# Altium footprint library RODION.PcbLib: 131 footprints (part 3 of 9)
Each footprint in its own frame and in the unit in brackets; x right, y up, seen from the top. Pads: shape width x height; smd on the part's side, far side on the other; paste and mask are expansions set on the pad; w line width, h text height; cw(c..) or ccw(c..) is an arc to the next point about the centre after c.
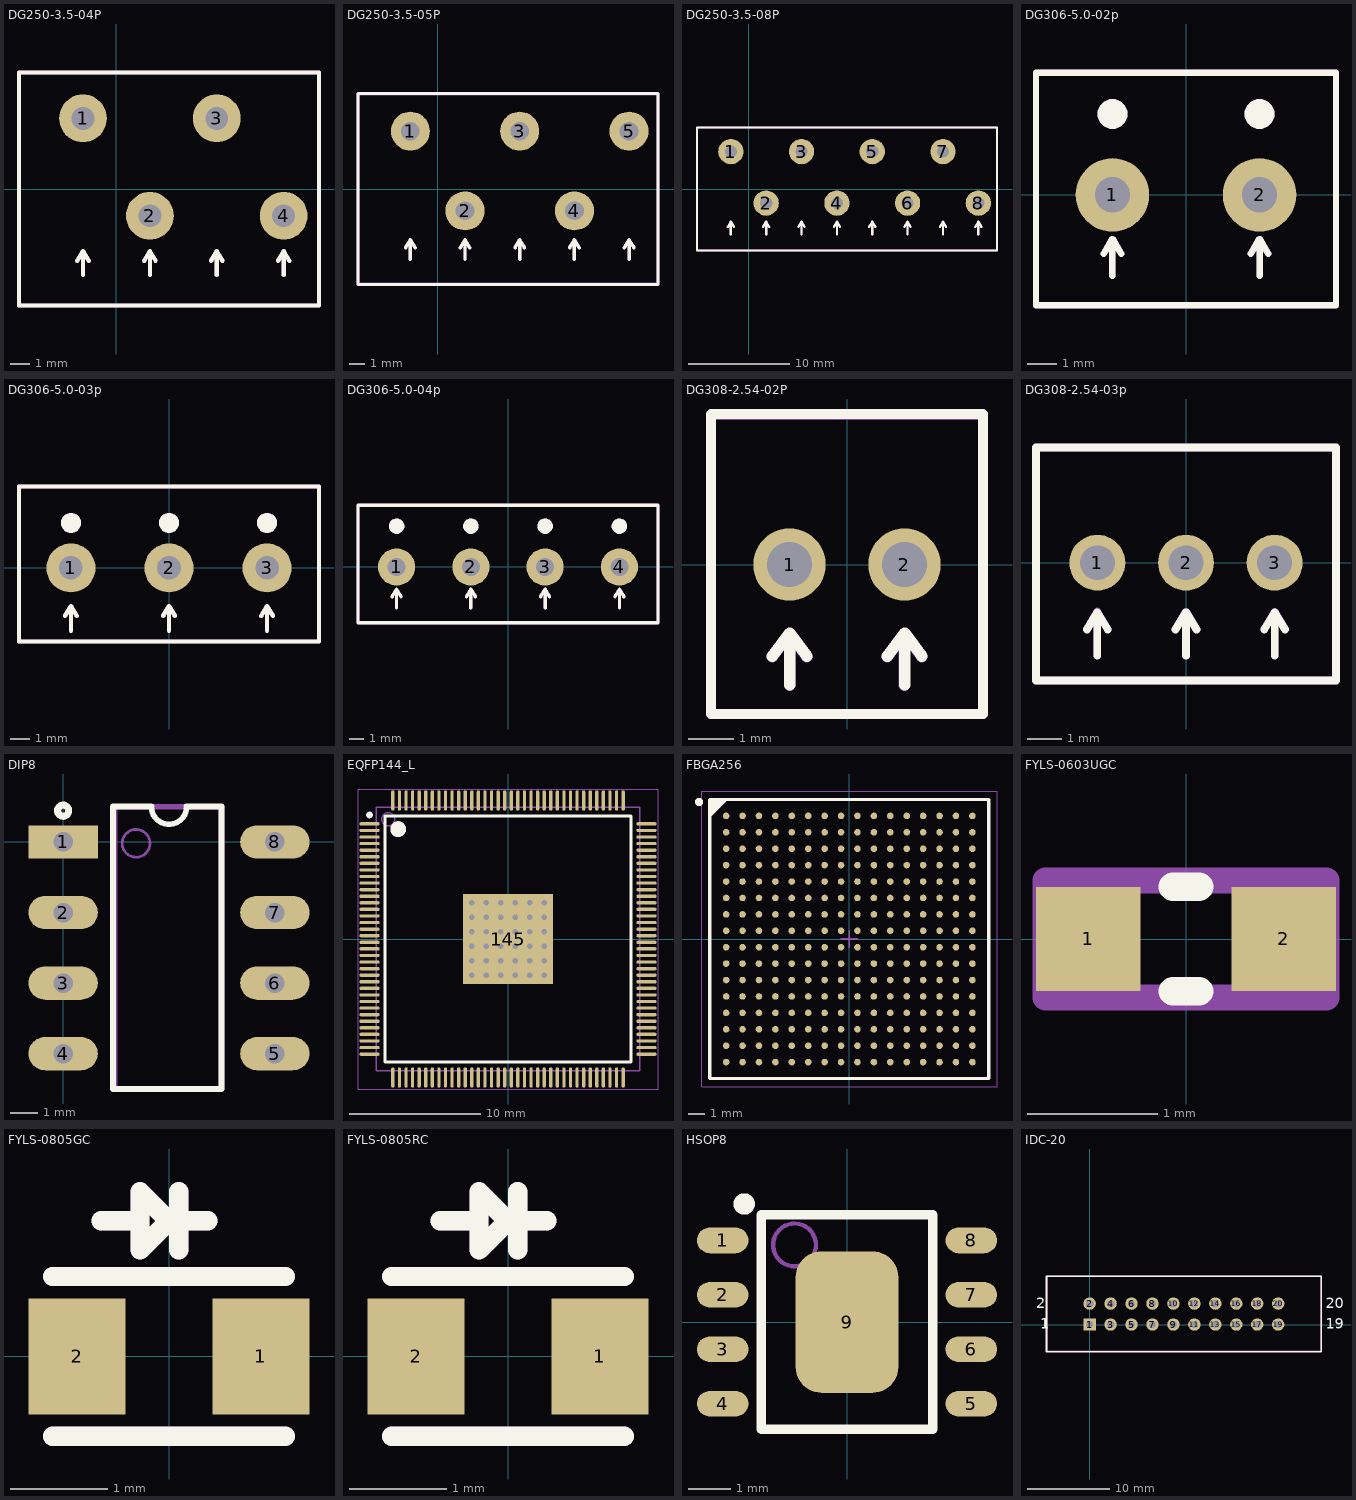
[diagram p2: the footprints below, top view; thin cyan lines are the x and y axes]

## DG250-3.5-04P [mm] "DG250-5.0-4p Connector"
height 12
pads (4):
  round 2.5 hole 1.2: 1(-1.75,3.7) 2(1.75,-1.4) 3(5.25,3.7) 4(8.75,-1.4)
Top Overlay:
  lines w0.2: -5.1,-6.1 -5.1,6.1 10.6,6.1 10.6,-6.1 -5.1,-6.1
  lines w0.22: -2.05,-3.75 -1.75,-3.25 ; -1.75,-4.5 -1.75,-3.25 ; -1.45,-3.75 -1.75,-3.25 ; 1.45,-3.75 1.75,-3.25 ; 1.75,-4.5 1.75,-3.25 ; 2.05,-3.75 1.75,-3.25 ; 4.95,-3.75 5.25,-3.25 ; 5.25,-4.5 5.25,-3.25 ; 5.55,-3.75 5.25,-3.25 ; 8.45,-3.75 8.75,-3.25 ; 8.75,-4.5 8.75,-3.25 ; 9.05,-3.75 8.75,-3.25
Top_Assy:
  lines w0.22: -2.05,-3.75 -1.75,-3.25 ; -1.75,-4.5 -1.75,-3.25 ; -1.45,-3.75 -1.75,-3.25 ; 1.45,-3.75 1.75,-3.25 ; 1.75,-4.5 1.75,-3.25 ; 2.05,-3.75 1.75,-3.25 ; 4.95,-3.75 5.25,-3.25 ; 5.25,-4.5 5.25,-3.25 ; 5.55,-3.75 5.25,-3.25 ; 8.45,-3.75 8.75,-3.25 ; 8.75,-4.5 8.75,-3.25 ; 9.05,-3.75 8.75,-3.25 ; -5.1,-6.1 -5.1,6.1 10.6,6.1 10.6,-6.1 -5.1,-6.1
  text ".Designator" at -2.425,0.45 h1
3D body "DG250-3.5-4.stp": height 13.05, standoff -3.25, extent -5,-6 10.5,6

## DG250-3.5-05P [mm] "DG250-5.0-4p Connector"
height 12
pads (5):
  round 2.5 hole 1.2: 1(-1.75,3.7) 2(1.75,-1.4) 3(5.25,3.7) 4(8.75,-1.4) 5(12.25,3.7)
Top Overlay:
  lines w0.2: -5.1,-6.1 14.1,-6.1 14.1,6.1 -5.1,6.1 -5.1,-6.1
  lines w0.22: -2.05,-3.75 -1.75,-3.25 ; -1.75,-4.5 -1.75,-3.25 ; -1.45,-3.75 -1.75,-3.25 ; 1.45,-3.75 1.75,-3.25 ; 1.75,-4.5 1.75,-3.25 ; 2.05,-3.75 1.75,-3.25 ; 4.95,-3.75 5.25,-3.25 ; 5.25,-4.5 5.25,-3.25 ; 5.55,-3.75 5.25,-3.25 ; 8.45,-3.75 8.75,-3.25 ; 8.75,-4.5 8.75,-3.25 ; 9.05,-3.75 8.75,-3.25 ; 11.95,-3.75 12.25,-3.25 ; 12.25,-4.5 12.25,-3.25 ; 12.55,-3.75 12.25,-3.25
Top_Assy:
  lines w0.22: -2.05,-3.75 -1.75,-3.25 ; -1.75,-4.5 -1.75,-3.25 ; -1.45,-3.75 -1.75,-3.25 ; 1.45,-3.75 1.75,-3.25 ; 1.75,-4.5 1.75,-3.25 ; 2.05,-3.75 1.75,-3.25 ; 4.95,-3.75 5.25,-3.25 ; 5.25,-4.5 5.25,-3.25 ; 5.55,-3.75 5.25,-3.25 ; 8.45,-3.75 8.75,-3.25 ; 8.75,-4.5 8.75,-3.25 ; 9.05,-3.75 8.75,-3.25 ; 11.95,-3.75 12.25,-3.25 ; 12.25,-4.5 12.25,-3.25 ; 12.55,-3.75 12.25,-3.25 ; -5.1,-6.1 14.1,-6.1 14.1,6.1 -5.1,6.1 -5.1,-6.1
  text ".Designator" at 0.375,1.05 h1
3D body "DG250-3.5-5.stp": height 13.05, standoff -3.25, extent -5,-6 14,6

## DG250-3.5-08P [mm] "DG250-5.0-8p Connector"
height 12
pads (8):
  round 2.5 hole 1.2: 1(-1.75,3.7) 2(1.75,-1.4) 3(5.25,3.7) 4(8.75,-1.4) 5(12.25,3.7) 6(15.75,-1.4) 7(19.25,3.7) 8(22.75,-1.4)
Top Overlay:
  lines w0.2: -5.1,-6.1 -5.1,6.1 24.6,6.1 24.6,-6.1 -5.1,-6.1
  lines w0.22: -2.05,-3.75 -1.75,-3.25 ; -1.75,-4.5 -1.75,-3.25 ; -1.45,-3.75 -1.75,-3.25 ; 1.45,-3.75 1.75,-3.25 ; 1.75,-4.5 1.75,-3.25 ; 2.05,-3.75 1.75,-3.25 ; 4.95,-3.75 5.25,-3.25 ; 5.25,-4.5 5.25,-3.25 ; 5.55,-3.75 5.25,-3.25 ; 8.45,-3.75 8.75,-3.25 ; 8.75,-4.5 8.75,-3.25 ; 9.05,-3.75 8.75,-3.25 ; 11.95,-3.75 12.25,-3.25 ; 12.25,-4.5 12.25,-3.25 ; 12.55,-3.75 12.25,-3.25 ; 15.45,-3.75 15.75,-3.25 ; 15.75,-4.5 15.75,-3.25 ; 16.05,-3.75 15.75,-3.25 ; 18.95,-3.75 19.25,-3.25 ; 19.25,-4.5 19.25,-3.25 ; 19.55,-3.75 19.25,-3.25 ; 22.45,-3.75 22.75,-3.25 ; 22.75,-4.5 22.75,-3.25 ; 23.05,-3.75 22.75,-3.25
Top_Assy:
  lines w0.22: -2.05,-3.75 -1.75,-3.25 ; -1.75,-4.5 -1.75,-3.25 ; -1.45,-3.75 -1.75,-3.25 ; 1.45,-3.75 1.75,-3.25 ; 1.75,-4.5 1.75,-3.25 ; 2.05,-3.75 1.75,-3.25 ; 4.95,-3.75 5.25,-3.25 ; 5.25,-4.5 5.25,-3.25 ; 5.55,-3.75 5.25,-3.25 ; 8.45,-3.75 8.75,-3.25 ; 8.75,-4.5 8.75,-3.25 ; 9.05,-3.75 8.75,-3.25 ; 11.95,-3.75 12.25,-3.25 ; 12.25,-4.5 12.25,-3.25 ; 12.55,-3.75 12.25,-3.25 ; 15.45,-3.75 15.75,-3.25 ; 15.75,-4.5 15.75,-3.25 ; 16.05,-3.75 15.75,-3.25 ; 18.95,-3.75 19.25,-3.25 ; 19.25,-4.5 19.25,-3.25 ; 19.55,-3.75 19.25,-3.25 ; 22.45,-3.75 22.75,-3.25 ; 22.75,-4.5 22.75,-3.25 ; 23.05,-3.75 22.75,-3.25 ; -5.1,-6.1 -5.1,6.1 24.6,6.1 24.6,-6.1 -5.1,-6.1
  text ".Designator" at 3.7,1.4 h1
3D body "DG250-3.5-8.stp": height 13.05, standoff -3.25, extent -5,-6 24.5,6

## DG306-5.0-02p [mm] "DG306-5.0-2p Connector"
height 10
pads (2):
  round 2.5 hole 1.2: 1(-2.5,0) 2(2.5,0)
Top Overlay:
  region: -2.5,2.25 -2.599,2.25 -2.783,2.326 -2.924,2.467 -3,2.651 -3,2.75 -3,2.849 -2.924,3.033 -2.783,3.174 -2.599,3.25 -2.5,3.25 -2.401,3.25 -2.217,3.174 -2.076,3.033 -2,2.849 -2,2.75 -2,2.651 -2.076,2.467 -2.217,2.326 -2.401,2.25
  region: 2.5,2.25 2.401,2.25 2.217,2.326 2.076,2.467 2,2.651 2,2.75 2,2.849 2.076,3.033 2.217,3.174 2.401,3.25 2.5,3.25 2.599,3.25 2.783,3.174 2.924,3.033 3,2.849 3,2.75 3,2.651 2.924,2.467 2.783,2.326 2.599,2.25
  lines w0.22: -2.8,-2 -2.5,-1.5 ; -2.5,-2.75 -2.5,-1.5 ; -2.2,-2 -2.5,-1.5 ; 2.2,-2 2.5,-1.5 ; 2.5,-2.75 2.5,-1.5 ; 2.8,-2 2.5,-1.5 ; -5.1,-3.75 -5.1,4.15 5.1,4.15 5.1,-3.75 -5.1,-3.75
Top_Assy:
  region: -2.5,2.25 -2.599,2.25 -2.783,2.326 -2.924,2.467 -3,2.651 -3,2.75 -3,2.849 -2.924,3.033 -2.783,3.174 -2.599,3.25 -2.5,3.25 -2.401,3.25 -2.217,3.174 -2.076,3.033 -2,2.849 -2,2.75 -2,2.651 -2.076,2.467 -2.217,2.326 -2.401,2.25
  region: 2.5,2.25 2.401,2.25 2.217,2.326 2.076,2.467 2,2.651 2,2.75 2,2.849 2.076,3.033 2.217,3.174 2.401,3.25 2.5,3.25 2.599,3.25 2.783,3.174 2.924,3.033 3,2.849 3,2.75 3,2.651 2.924,2.467 2.783,2.326 2.599,2.25
  lines w0.22: -2.8,-2 -2.5,-1.5 ; -2.5,-2.75 -2.5,-1.5 ; -2.2,-2 -2.5,-1.5 ; 2.2,-2 2.5,-1.5 ; 2.5,-2.75 2.5,-1.5 ; 2.8,-2 2.5,-1.5 ; -5.1,-3.75 -5.1,4.15 5.1,4.15 5.1,-3.75 -5.1,-3.75
  text ".Designator" at -1.525,0.65 h1
3D body "KRM2.STEP": height 10, standoff -4, extent -5,-3.5 5,4

## DG306-5.0-03p [mm] "DG306-5.0-3p Connector"
height 10
pads (3):
  round 2.5 hole 1.2: 1(-5,0) 2(0,0) 3(5,0)
Top Overlay:
  region: -5,1.8 -5.099,1.8 -5.283,1.876 -5.424,2.017 -5.5,2.201 -5.5,2.3 -5.5,2.399 -5.424,2.583 -5.283,2.724 -5.099,2.8 -5,2.8 -4.901,2.8 -4.717,2.724 -4.576,2.583 -4.5,2.399 -4.5,2.3 -4.5,2.201 -4.576,2.017 -4.717,1.876 -4.901,1.8
  region: 0,1.8 -0.099,1.8 -0.283,1.876 -0.424,2.017 -0.5,2.201 -0.5,2.3 -0.5,2.399 -0.424,2.583 -0.283,2.724 -0.099,2.8 0,2.8 0.099,2.8 0.283,2.724 0.424,2.583 0.5,2.399 0.5,2.3 0.5,2.201 0.424,2.017 0.283,1.876 0.099,1.8
  region: 4.5,2.3 4.5,2.201 4.576,2.017 4.717,1.876 4.901,1.8 5,1.8 5.099,1.8 5.283,1.876 5.424,2.017 5.5,2.201 5.5,2.3 5.5,2.399 5.424,2.583 5.283,2.724 5.099,2.8 5,2.8 4.901,2.8 4.717,2.724 4.576,2.583 4.5,2.399
  lines w0.22: -5.3,-2.45 -5,-1.95 ; -5,-3.2 -5,-1.95 ; -4.7,-2.45 -5,-1.95 ; -0.3,-2.45 0,-1.95 ; 0,-3.2 0,-1.95 ; 0.3,-2.45 0,-1.95 ; 4.7,-2.45 5,-1.95 ; 5,-3.2 5,-1.95 ; 5.3,-2.45 5,-1.95 ; -7.65,-3.75 7.65,-3.75 7.65,4.15 -7.65,4.15 -7.65,-3.75
Top_Assy:
  region: -5,1.8 -5.099,1.8 -5.283,1.876 -5.424,2.017 -5.5,2.201 -5.5,2.3 -5.5,2.399 -5.424,2.583 -5.283,2.724 -5.099,2.8 -5,2.8 -4.901,2.8 -4.717,2.724 -4.576,2.583 -4.5,2.399 -4.5,2.3 -4.5,2.201 -4.576,2.017 -4.717,1.876 -4.901,1.8
  region: 0,1.8 -0.099,1.8 -0.283,1.876 -0.424,2.017 -0.5,2.201 -0.5,2.3 -0.5,2.399 -0.424,2.583 -0.283,2.724 -0.099,2.8 0,2.8 0.099,2.8 0.283,2.724 0.424,2.583 0.5,2.399 0.5,2.3 0.5,2.201 0.424,2.017 0.283,1.876 0.099,1.8
  region: 4.5,2.3 4.5,2.201 4.576,2.017 4.717,1.876 4.901,1.8 5,1.8 5.099,1.8 5.283,1.876 5.424,2.017 5.5,2.201 5.5,2.3 5.5,2.399 5.424,2.583 5.283,2.724 5.099,2.8 5,2.8 4.901,2.8 4.717,2.724 4.576,2.583 4.5,2.399
  lines w0.22: -5.3,-2.45 -5,-1.95 ; -5,-3.2 -5,-1.95 ; -4.7,-2.45 -5,-1.95 ; -0.3,-2.45 0,-1.95 ; 0,-3.2 0,-1.95 ; 0.3,-2.45 0,-1.95 ; 4.7,-2.45 5,-1.95 ; 5,-3.2 5,-1.95 ; 5.3,-2.45 5,-1.95 ; -7.65,-3.75 7.65,-3.75 7.65,4.15 -7.65,4.15 -7.65,-3.75
  text ".Designator" at -2.75,0.825 h1
3D body "KRM3.STEP": height 10, standoff -4, extent -7.5,-3.5 7.5,4

## DG306-5.0-04p [mm] "DG306-5.0-4p Connector"
height 10
pads (4):
  round 2.5 hole 1.2: 1(-7.5,0) 2(-2.5,0) 3(2.5,0) 4(7.5,0)
Top Overlay:
  region: 7,2.75 7,2.651 7.076,2.467 7.217,2.326 7.401,2.25 7.5,2.25 7.599,2.25 7.783,2.326 7.924,2.467 8,2.651 8,2.75 8,2.849 7.924,3.033 7.783,3.174 7.599,3.25 7.5,3.25 7.401,3.25 7.217,3.174 7.076,3.033 7,2.849
  region: -7.5,2.25 -7.599,2.25 -7.783,2.326 -7.924,2.467 -8,2.651 -8,2.75 -8,2.849 -7.924,3.033 -7.783,3.174 -7.599,3.25 -7.5,3.25 -7.401,3.25 -7.217,3.174 -7.076,3.033 -7,2.849 -7,2.75 -7,2.651 -7.076,2.467 -7.217,2.326 -7.401,2.25
  region: 2.5,2.25 2.401,2.25 2.217,2.326 2.076,2.467 2,2.651 2,2.75 2,2.849 2.076,3.033 2.217,3.174 2.401,3.25 2.5,3.25 2.599,3.25 2.783,3.174 2.924,3.033 3,2.849 3,2.75 3,2.651 2.924,2.467 2.783,2.326 2.599,2.25
  region: -2.5,2.25 -2.599,2.25 -2.783,2.326 -2.924,2.467 -3,2.651 -3,2.75 -3,2.849 -2.924,3.033 -2.783,3.174 -2.599,3.25 -2.5,3.25 -2.401,3.25 -2.217,3.174 -2.076,3.033 -2,2.849 -2,2.75 -2,2.651 -2.076,2.467 -2.217,2.326 -2.401,2.25
  lines w0.22: -7.8,-2 -7.5,-1.5 ; -7.5,-2.75 -7.5,-1.5 ; -7.2,-2 -7.5,-1.5 ; -2.8,-2 -2.5,-1.5 ; -2.5,-2.75 -2.5,-1.5 ; -2.2,-2 -2.5,-1.5 ; 2.2,-2 2.5,-1.5 ; 2.5,-2.75 2.5,-1.5 ; 2.8,-2 2.5,-1.5 ; 7.2,-2 7.5,-1.5 ; 7.5,-2.75 7.5,-1.5 ; 7.8,-2 7.5,-1.5 ; -10.1,-3.75 10.1,-3.75 10.1,4.15 -10.1,4.15 -10.1,-3.75
Top_Assy:
  region: 7,2.75 7,2.651 7.076,2.467 7.217,2.326 7.401,2.25 7.5,2.25 7.599,2.25 7.783,2.326 7.924,2.467 8,2.651 8,2.75 8,2.849 7.924,3.033 7.783,3.174 7.599,3.25 7.5,3.25 7.401,3.25 7.217,3.174 7.076,3.033 7,2.849
  region: -7.5,2.25 -7.599,2.25 -7.783,2.326 -7.924,2.467 -8,2.651 -8,2.75 -8,2.849 -7.924,3.033 -7.783,3.174 -7.599,3.25 -7.5,3.25 -7.401,3.25 -7.217,3.174 -7.076,3.033 -7,2.849 -7,2.75 -7,2.651 -7.076,2.467 -7.217,2.326 -7.401,2.25
  region: 2.5,2.25 2.401,2.25 2.217,2.326 2.076,2.467 2,2.651 2,2.75 2,2.849 2.076,3.033 2.217,3.174 2.401,3.25 2.5,3.25 2.599,3.25 2.783,3.174 2.924,3.033 3,2.849 3,2.75 3,2.651 2.924,2.467 2.783,2.326 2.599,2.25
  region: -2.5,2.25 -2.599,2.25 -2.783,2.326 -2.924,2.467 -3,2.651 -3,2.75 -3,2.849 -2.924,3.033 -2.783,3.174 -2.599,3.25 -2.5,3.25 -2.401,3.25 -2.217,3.174 -2.076,3.033 -2,2.849 -2,2.75 -2,2.651 -2.076,2.467 -2.217,2.326 -2.401,2.25
  lines w0.22: -7.8,-2 -7.5,-1.5 ; -7.5,-2.75 -7.5,-1.5 ; -7.2,-2 -7.5,-1.5 ; -2.8,-2 -2.5,-1.5 ; -2.5,-2.75 -2.5,-1.5 ; -2.2,-2 -2.5,-1.5 ; 2.2,-2 2.5,-1.5 ; 2.5,-2.75 2.5,-1.5 ; 2.8,-2 2.5,-1.5 ; 7.2,-2 7.5,-1.5 ; 7.5,-2.75 7.5,-1.5 ; 7.8,-2 7.5,-1.5 ; -10.1,-3.75 10.1,-3.75 10.1,4.15 -10.1,4.15 -10.1,-3.75
  text ".Designator" at -4.6,0.95 h1
3D body "KRM4.STEP": height 10, standoff -4, extent -10,-3.5 10,4

## DG308-2.54-02P [mm] "DG308-2.54-02P Connector"
height 8.5
pads (2):
  round 1.6 hole 1: 1(-1.27,0) 2(1.27,0)
Top Overlay:
  lines w0.22: -3,-3.3 3,-3.3 3,3.325 -3,3.325 -3,-3.3
  lines w0.254: -1.646,-2.025 -1.265,-1.517 ; -1.265,-2.66 -1.265,-1.517 ; -0.884,-2.025 -1.265,-1.517 ; 0.894,-2.025 1.275,-1.517 ; 1.275,-2.66 1.275,-1.517 ; 1.656,-2.025 1.275,-1.517
Top_Assy:
  lines w0.22: -3,-3.302 3,-3.302 3,3.302 -3,3.302 -3,-3.302
  lines w0.254: -1.651,-2.032 -1.27,-1.524 ; -1.27,-2.667 -1.27,-1.524 ; -0.889,-2.032 -1.27,-1.524 ; 0.889,-2.032 1.27,-1.524 ; 1.27,-2.667 1.27,-1.524 ; 1.651,-2.032 1.27,-1.524
  text ".Designator" at -1.525,0.375 h1
3D body "DG308-2.54-2P.stp": height 8.5, standoff -3.5, extent -2.77,-3.125 2.77,3.075

## DG308-2.54-03p [mm] "DG308-2.54-3p Connector"
height 8.5
pads (3):
  round 1.6 hole 1: 1(-2.54,0) 2(0,0) 3(2.54,0)
Top Overlay:
  lines w0.22: -2.84,-1.917 -2.54,-1.417 ; -2.54,-2.667 -2.54,-1.417 ; -2.24,-1.917 -2.54,-1.417 ; -0.3,-1.917 0,-1.417 ; 0,-2.667 0,-1.417 ; 0.3,-1.917 0,-1.417 ; 2.24,-1.917 2.54,-1.417 ; 2.54,-2.667 2.54,-1.417 ; 2.84,-1.917 2.54,-1.417 ; -4.3,-3.375 4.3,-3.375 4.3,3.3 -4.3,3.3 -4.3,-3.375
Top_Assy:
  lines w0.22: -2.84,-1.9 -2.54,-1.4 ; -2.54,-2.65 -2.54,-1.4 ; -2.24,-1.9 -2.54,-1.4 ; -0.3,-1.904 0,-1.404 ; 0,-2.654 0,-1.404 ; 0.3,-1.904 0,-1.404 ; 2.24,-1.902 2.54,-1.402 ; 2.54,-2.652 2.54,-1.402 ; 2.84,-1.902 2.54,-1.402 ; -4.3,-3.375 4.3,-3.375 4.3,3.3 -4.3,3.3 -4.3,-3.375
  text ".Designator" at -0.7,0.4 h1
3D body "DG308-2.54-3P.stp": height 8.5, standoff -3.5, extent -4.04,-3.125 4.04,3.075

## DIP8 [mm]
pads (8):
  rect 2.5x1.2 hole 0.7: 1(0,0)
  oval 2.5x1.2 hole 0.7: 2(0,-2.54) 3(0,-5.08) 4(0,-7.62) 5(7.62,-7.62) 6(7.62,-5.08) 7(7.62,-2.54) 8(7.62,0)
Top Overlay:
  circle w0.254: c0,1.125 r0.2
  lines w0.2: 3.175,1.27 ccw(c3.81,1.27) 4.445,1.27
  lines w0.22: 3.175,1.27 1.8,1.27 1.8,-8.89 5.7,-8.89 5.7,1.27 4.445,1.27
Top_Assy:
  circle w0.1: c2.625,-0.05 r0.5
  lines w0.2: 1.85,-8.875 1.85,1.27 5.7,1.27 5.7,-8.875 1.85,-8.875
  text ".Designator" at 2.625,-3.325 h1

## EQFP144_L [mm] "Shrink QFP, 144-Leads, Body 20x20mm, Pitch 0.5mm, Thermal Pad 6.85x6.85mm, IPC High Density"
height 1.65
pads (145):
  oval 1.55x0.25 smd: 1(-10.525,8.75) 2(-10.525,8.25) 3(-10.525,7.75) 4(-10.525,7.25) 5(-10.525,6.75) 6(-10.525,6.25) 7(-10.525,5.75) 8(-10.525,5.25) 9(-10.525,4.75) 10(-10.525,4.25) 11(-10.525,3.75) 12(-10.525,3.25) 13(-10.525,2.75) 14(-10.525,2.25) 15(-10.525,1.75) 16(-10.525,1.25) 17(-10.525,0.75) 18(-10.525,0.25) 19(-10.525,-0.25) 20(-10.525,-0.75) 21(-10.525,-1.25) 22(-10.525,-1.75) 23(-10.525,-2.25) 24(-10.525,-2.75) 25(-10.525,-3.25) 26(-10.525,-3.75) 27(-10.525,-4.25) 28(-10.525,-4.75) 29(-10.525,-5.25) 30(-10.525,-5.75) 31(-10.525,-6.25) 32(-10.525,-6.75) 33(-10.525,-7.25) 34(-10.525,-7.75) 35(-10.525,-8.25) 36(-10.525,-8.75) 73(10.525,-8.75) 74(10.525,-8.25) 75(10.525,-7.75) 76(10.525,-7.25) 77(10.525,-6.75) 78(10.525,-6.25) 79(10.525,-5.75) 80(10.525,-5.25) 81(10.525,-4.75) 82(10.525,-4.25) 83(10.525,-3.75) 84(10.525,-3.25) 85(10.525,-2.75) 86(10.525,-2.25) 87(10.525,-1.75) 88(10.525,-1.25) 89(10.525,-0.75) 90(10.525,-0.25) 91(10.525,0.25) 92(10.525,0.75) 93(10.525,1.25) 94(10.525,1.75) 95(10.525,2.25) 96(10.525,2.75) 97(10.525,3.25) 98(10.525,3.75) 99(10.525,4.25) 100(10.525,4.75) 101(10.525,5.25) 102(10.525,5.75) 103(10.525,6.25) 104(10.525,6.75) 105(10.525,7.25) 106(10.525,7.75) 107(10.525,8.25) 108(10.525,8.75)
  oval 0.25x1.55 smd: 37(-8.75,-10.525) 38(-8.25,-10.525) 39(-7.75,-10.525) 40(-7.25,-10.525) 41(-6.75,-10.525) 42(-6.25,-10.525) 43(-5.75,-10.525) 44(-5.25,-10.525) 45(-4.75,-10.525) 46(-4.25,-10.525) 47(-3.75,-10.525) 48(-3.25,-10.525) 49(-2.75,-10.525) 50(-2.25,-10.525) 51(-1.75,-10.525) 52(-1.25,-10.525) 53(-0.75,-10.525) 54(-0.25,-10.525) 55(0.25,-10.525) 56(0.75,-10.525) 57(1.25,-10.525) 58(1.75,-10.525) 59(2.25,-10.525) 60(2.75,-10.525) 61(3.25,-10.525) 62(3.75,-10.525) 63(4.25,-10.525) 64(4.75,-10.525) 65(5.25,-10.525) 66(5.75,-10.525) 67(6.25,-10.525) 68(6.75,-10.525) 69(7.25,-10.525) 70(7.75,-10.525) 71(8.25,-10.525) 72(8.75,-10.525) 109(8.75,10.525) 110(8.25,10.525) 111(7.75,10.525) 112(7.25,10.525) 113(6.75,10.525) 114(6.25,10.525) 115(5.75,10.525) 116(5.25,10.525) 117(4.75,10.525) 118(4.25,10.525) 119(3.75,10.525) 120(3.25,10.525) 121(2.75,10.525) 122(2.25,10.525) 123(1.75,10.525) 124(1.25,10.525) 125(0.75,10.525) 126(0.25,10.525) 127(-0.25,10.525) 128(-0.75,10.525) 129(-1.25,10.525) 130(-1.75,10.525) 131(-2.25,10.525) 132(-2.75,10.525) 133(-3.25,10.525) 134(-3.75,10.525) 135(-4.25,10.525) 136(-4.75,10.525) 137(-5.25,10.525) 138(-5.75,10.525) 139(-6.25,10.525) 140(-6.75,10.525) 141(-7.25,10.525) 142(-7.75,10.525) 143(-8.25,10.525) 144(-8.75,10.525)
  rect 6.85x6.85 smd: 145(0,0)
via -2.75,2.75 diameter 0.8 hole 0.4
via -1.65,2.75 diameter 0.8 hole 0.4
via -0.55,2.75 diameter 0.8 hole 0.4
via 0.55,2.75 diameter 0.8 hole 0.4
via 1.65,2.75 diameter 0.8 hole 0.4
via 2.75,2.75 diameter 0.8 hole 0.4
via -2.75,1.65 diameter 0.8 hole 0.4
via -1.65,1.65 diameter 0.8 hole 0.4
via -0.55,1.65 diameter 0.8 hole 0.4
via 0.55,1.65 diameter 0.8 hole 0.4
via 1.65,1.65 diameter 0.8 hole 0.4
via 2.75,1.65 diameter 0.8 hole 0.4
via -2.75,0.55 diameter 0.8 hole 0.4
via -1.65,0.55 diameter 0.8 hole 0.4
via -0.55,0.55 diameter 0.8 hole 0.4
via 0.55,0.55 diameter 0.8 hole 0.4
via 1.65,0.55 diameter 0.8 hole 0.4
via 2.75,0.55 diameter 0.8 hole 0.4
via -2.75,-0.55 diameter 0.8 hole 0.4
via -1.65,-0.55 diameter 0.8 hole 0.4
via -0.55,-0.55 diameter 0.8 hole 0.4
via 0.55,-0.55 diameter 0.8 hole 0.4
via 1.65,-0.55 diameter 0.8 hole 0.4
via 2.75,-0.55 diameter 0.8 hole 0.4
via -2.75,-1.65 diameter 0.8 hole 0.4
via -1.65,-1.65 diameter 0.8 hole 0.4
via -0.55,-1.65 diameter 0.8 hole 0.4
via 0.55,-1.65 diameter 0.8 hole 0.4
via 1.65,-1.65 diameter 0.8 hole 0.4
via 2.75,-1.65 diameter 0.8 hole 0.4
via -2.75,-2.75 diameter 0.8 hole 0.4
via -1.65,-2.75 diameter 0.8 hole 0.4
via -0.55,-2.75 diameter 0.8 hole 0.4
via 0.55,-2.75 diameter 0.8 hole 0.4
via 1.65,-2.75 diameter 0.8 hole 0.4
via 2.75,-2.75 diameter 0.8 hole 0.4
Top Overlay:
  circle w0.25: c-10.525,9.425 r0.125
  circle w0.6: c-8.35,8.35 r0.3
  lines w0.2: -9.35,-9.35 -9.35,9.35 9.35,9.35 9.35,-9.35 -9.35,-9.35
Top_Assy:
  circle w0.1: c-9.1,9.1 r0.5
  lines w0.1: -10,-10 -10,10 10,10 10,-10 -10,-10
Mechanical 15:
  lines w0.05: -11.4,-11.4 -11.4,11.4 11.4,11.4 11.4,-11.4 -11.4,-11.4
  lines w0.1: -0.5,0 0.5,0 ; 0,-0.5 0,0.5
3D body "User Library-LQFP144-3.STEP": height 1.87, standoff -0.02, extent -11.101,-11.101 11.101,11.101

## FBGA256 [mm] "BGA, 256-Leads, Body 17x17mm, Pitch 1mm"
height 1.55
pads (256):
  round 0.4 smd: A1(-7.5,7.5) A2(-6.5,7.5) A3(-5.5,7.5) A4(-4.5,7.5) A5(-3.5,7.5) A6(-2.5,7.5) A7(-1.5,7.5) A8(-0.5,7.5) A9(0.5,7.5) A10(1.5,7.5) A11(2.5,7.5) A12(3.5,7.5) A13(4.5,7.5) A14(5.5,7.5) A15(6.5,7.5) A16(7.5,7.5) B1(-7.5,6.5) B2(-6.5,6.5) B3(-5.5,6.5) B4(-4.5,6.5) B5(-3.5,6.5) B6(-2.5,6.5) B7(-1.5,6.5) B8(-0.5,6.5) B9(0.5,6.5) B10(1.5,6.5) B11(2.5,6.5) B12(3.5,6.5) B13(4.5,6.5) B14(5.5,6.5) B15(6.5,6.5) B16(7.5,6.5) C1(-7.5,5.5) C2(-6.5,5.5) C3(-5.5,5.5) C4(-4.5,5.5) C5(-3.5,5.5) C6(-2.5,5.5) C7(-1.5,5.5) C8(-0.5,5.5) C9(0.5,5.5) C10(1.5,5.5) C11(2.5,5.5) C12(3.5,5.5) C13(4.5,5.5) C14(5.5,5.5) C15(6.5,5.5) C16(7.5,5.5) D1(-7.5,4.5) D2(-6.5,4.5) D3(-5.5,4.5) D4(-4.5,4.5) D5(-3.5,4.5) D6(-2.5,4.5) D7(-1.5,4.5) D8(-0.5,4.5) D9(0.5,4.5) D10(1.5,4.5) D11(2.5,4.5) D12(3.5,4.5) D13(4.5,4.5) D14(5.5,4.5) D15(6.5,4.5) D16(7.5,4.5) E1(-7.5,3.5) E2(-6.5,3.5) E3(-5.5,3.5) E4(-4.5,3.5) E5(-3.5,3.5) E6(-2.5,3.5) E7(-1.5,3.5) E8(-0.5,3.5) E9(0.5,3.5) E10(1.5,3.5) E11(2.5,3.5) E12(3.5,3.5) E13(4.5,3.5) E14(5.5,3.5) E15(6.5,3.5) E16(7.5,3.5) F1(-7.5,2.5) F2(-6.5,2.5) F3(-5.5,2.5) F4(-4.5,2.5) F5(-3.5,2.5) F6(-2.5,2.5) F7(-1.5,2.5) F8(-0.5,2.5) F9(0.5,2.5) F10(1.5,2.5) F11(2.5,2.5) F12(3.5,2.5) F13(4.5,2.5) F14(5.5,2.5) F15(6.5,2.5) F16(7.5,2.5) G1(-7.5,1.5) G2(-6.5,1.5) G3(-5.5,1.5) G4(-4.5,1.5) G5(-3.5,1.5) G6(-2.5,1.5) G7(-1.5,1.5) G8(-0.5,1.5) G9(0.5,1.5) G10(1.5,1.5) G11(2.5,1.5) G12(3.5,1.5) G13(4.5,1.5) G14(5.5,1.5) G15(6.5,1.5) G16(7.5,1.5) H1(-7.5,0.5) H2(-6.5,0.5) H3(-5.5,0.5) H4(-4.5,0.5) H5(-3.5,0.5) H6(-2.5,0.5) H7(-1.5,0.5) H8(-0.5,0.5) H9(0.5,0.5) H10(1.5,0.5) H11(2.5,0.5) H12(3.5,0.5) H13(4.5,0.5) H14(5.5,0.5) H15(6.5,0.5) H16(7.5,0.5) J1(-7.5,-0.5) J2(-6.5,-0.5) J3(-5.5,-0.5) J4(-4.5,-0.5) J5(-3.5,-0.5) J6(-2.5,-0.5) J7(-1.5,-0.5) J8(-0.5,-0.5) J9(0.5,-0.5) J10(1.5,-0.5) J11(2.5,-0.5) J12(3.5,-0.5) J13(4.5,-0.5) J14(5.5,-0.5) J15(6.5,-0.5) J16(7.5,-0.5) K1(-7.5,-1.5) K2(-6.5,-1.5) K3(-5.5,-1.5) K4(-4.5,-1.5) K5(-3.5,-1.5) K6(-2.5,-1.5) K7(-1.5,-1.5) K8(-0.5,-1.5) K9(0.5,-1.5) K10(1.5,-1.5) K11(2.5,-1.5) K12(3.5,-1.5) K13(4.5,-1.5) K14(5.5,-1.5) K15(6.5,-1.5) K16(7.5,-1.5) L1(-7.5,-2.5) L2(-6.5,-2.5) L3(-5.5,-2.5) L4(-4.5,-2.5) L5(-3.5,-2.5) L6(-2.5,-2.5) L7(-1.5,-2.5) L8(-0.5,-2.5) L9(0.5,-2.5) L10(1.5,-2.5) L11(2.5,-2.5) L12(3.5,-2.5) L13(4.5,-2.5) L14(5.5,-2.5) L15(6.5,-2.5) L16(7.5,-2.5) M1(-7.5,-3.5) M2(-6.5,-3.5) M3(-5.5,-3.5) M4(-4.5,-3.5) M5(-3.5,-3.5) M6(-2.5,-3.5) M7(-1.5,-3.5) M8(-0.5,-3.5) M9(0.5,-3.5) M10(1.5,-3.5) M11(2.5,-3.5) M12(3.5,-3.5) M13(4.5,-3.5) M14(5.5,-3.5) M15(6.5,-3.5) M16(7.5,-3.5) N1(-7.5,-4.5) N2(-6.5,-4.5) N3(-5.5,-4.5) N4(-4.5,-4.5) N5(-3.5,-4.5) N6(-2.5,-4.5) N7(-1.5,-4.5) N8(-0.5,-4.5) N9(0.5,-4.5) N10(1.5,-4.5) N11(2.5,-4.5) N12(3.5,-4.5) N13(4.5,-4.5) N14(5.5,-4.5) N15(6.5,-4.5) N16(7.5,-4.5) P1(-7.5,-5.5) P2(-6.5,-5.5) P3(-5.5,-5.5) P4(-4.5,-5.5) P5(-3.5,-5.5) P6(-2.5,-5.5) P7(-1.5,-5.5) P8(-0.5,-5.5) P9(0.5,-5.5) P10(1.5,-5.5) P11(2.5,-5.5) P12(3.5,-5.5) P13(4.5,-5.5) P14(5.5,-5.5) P15(6.5,-5.5) P16(7.5,-5.5) R1(-7.5,-6.5) R2(-6.5,-6.5) R3(-5.5,-6.5) R4(-4.5,-6.5) R5(-3.5,-6.5) R6(-2.5,-6.5) R7(-1.5,-6.5) R8(-0.5,-6.5) R9(0.5,-6.5) R10(1.5,-6.5) R11(2.5,-6.5) R12(3.5,-6.5) R13(4.5,-6.5) R14(5.5,-6.5) R15(6.5,-6.5) R16(7.5,-6.5) T1(-7.5,-7.5) T2(-6.5,-7.5) T3(-5.5,-7.5) T4(-4.5,-7.5) T5(-3.5,-7.5) T6(-2.5,-7.5) T7(-1.5,-7.5) T8(-0.5,-7.5) T9(0.5,-7.5) T10(1.5,-7.5) T11(2.5,-7.5) T12(3.5,-7.5) T13(4.5,-7.5) T14(5.5,-7.5) T15(6.5,-7.5) T16(7.5,-7.5)
Top Overlay:
  circle w0.25: c-9.15,8.35 r0.125
  region: -7.5,8.5 -8.5,7.5 -8.5,8.5
  lines w0.2: -8.5,7.5 -7.5,8.5 ; -8.5,-8.5 -8.5,8.5 8.5,8.5 8.5,-8.5 -8.5,-8.5
Top_Assy:
  lines w0.1: -8.5,-8.5 -8.5,8.5 8.5,8.5 8.5,-8.5 -8.5,-8.5
Mechanical 15:
  lines w0.05: -9,-9 -9,9 9,9 9,-9 -9,-9
  lines w0.1: -0.5,0 0.5,0 ; 0,-0.5 0,0.5
3D body "FBGA256.step": height 2, standoff 0, extent -8.5,-8.5 8.5,8.5

## FYLS-0603UGC [mm] "Chip, Body 1.6x0.8mm, IPC High Density"
height 0.8
pads (2):
  rect 0.8x0.8 smd mask+0.05: 1(-0.75,0) 2(0.75,0)
Top Overlay:
  lines w0.22: -0.1,-0.4 0.1,-0.4 ; -0.1,0.4 0.1,0.4
Top_Assy:
  lines w0.2: -1.075,-0.45 -1.075,0.45 1.075,0.45 1.075,-0.45 -1.075,-0.45
  text ".Designator" at -0.9,-0.2 h1
3D body "FYLS-0603UGC.STEP": height 0.9, standoff 0, extent -0.85,-0.45 0.85,0.45

## FYLS-0805GC [mm] "Green LED 0805"
height 0.8
pads (2):
  rect 1x1.2 smd: 1(0.95,0) 2(-0.95,0)
Top Overlay:
  lines w0.2: -1.2,-0.825 1.2,-0.825 ; -1.2,0.825 1.2,0.825 ; -0.7,1.4 -0.3,1.4 ; 0.1,1.1 0.1,1.7 ; 0.4,1.4 0,1.4 ; 0,1.4 -0.3,1.1 -0.3,1.7 0,1.4
Top_Assy:
  lines w0.2: -1.2,-0.825 1.2,-0.825 ; -1.2,0.825 1.2,0.825 ; -0.7,1.4 -0.3,1.4 ; 0.1,1.1 0.1,1.7 ; 0.4,1.4 0,1.4 ; 0,1.4 -0.3,1.1 -0.3,1.7 0,1.4
  text ".Designator" at -1.15,-0.325 h1
3D body "SMD LED 0805.step": height 1.1, standoff 0, extent -1.01,-0.625 1.01,0.625

## FYLS-0805RC [mm] "Red LED 0805"
height 0.8
pads (2):
  rect 1x1.2 smd: 1(0.95,0) 2(-0.95,0)
Top Overlay:
  lines w0.2: -1.2,-0.825 1.2,-0.825 ; -1.2,0.825 1.2,0.825 ; -0.7,1.4 -0.3,1.4 ; 0.1,1.1 0.1,1.7 ; 0.4,1.4 0,1.4 ; 0,1.4 -0.3,1.1 -0.3,1.7 0,1.4
Top_Assy:
  lines w0.2: -1.2,-0.825 1.2,-0.825 ; -1.2,0.825 1.2,0.825 ; -0.7,1.4 -0.3,1.4 ; 0.1,1.1 0.1,1.7 ; 0.4,1.4 0,1.4 ; 0,1.4 -0.3,1.7 -0.3,1.1 0,1.4
  text ".Designator" at -1.2,-0.5 h1
3D body "SMD LED 0805 Red.step": height 1.1, standoff 0, extent -1.01,-0.625 1.01,0.625

## HSOP8 [mm] "HSOP, 8-Leads, Body 6.1x4.95mm, Pitch 1.27mm, IPC Medium Density"
height 1.75
pads (9):
  oval 1.2x0.6 smd: 1(-2.9,1.905) 2(-2.9,0.635) 3(-2.9,-0.635) 4(-2.9,-1.905) 5(2.9,-1.905) 6(2.9,-0.635) 7(2.9,0.635) 8(2.9,1.905)
  rrect50% 2.4x3.3 smd: 9(0,0)
Top Overlay:
  circle w0.25: c-2.4,2.755 r0.125
  lines w0.22: -2,-2.5 2,-2.5 2,2.5 -2,2.5 -2,-2.5
Top_Assy:
  circle w0.1: c-1.225,1.8 r0.5
  lines w0.2: -2,-2.5 2,-2.5 2,2.5 -2,2.5 -2,-2.5
  text ".Designator" at -0.4,-0.05 h1
3D body "HSOP8.STEP": height 1.74, standoff -0.01, extent -3.1,-2.5 3.1,2.5

## IDC-20 [mm] "Connector; IDC; 10x2 Position"
height 5.3
pads (20):
  rect 1.5x1.5 hole 0.9: 1(0,0)
  round 1.5 hole 0.9: 2(0,2.54) 3(2.54,0) 4(2.54,2.54) 5(5.08,0) 6(5.08,2.54) 7(7.62,0) 8(7.62,2.54) 9(10.16,0) 10(10.16,2.54) 11(12.7,0) 12(12.7,2.54) 13(15.24,0) 14(15.24,2.54) 15(17.78,0) 16(17.78,2.54) 17(20.32,0) 18(20.32,2.54) 19(22.86,0) 20(22.86,2.54)
Top Overlay:
  lines w0.2: -5.225,-3.3 28.1,-3.3 28.1,5.85 -5.225,5.85 -5.225,-3.3
  text "20" at 28.6,2 h1.27
  text "19" at 28.6,-0.5 h1.27
  text "1" at -6,-0.5 h1.27
  text "2" at -6.5,2 h1.27
Top_Assy:
  lines w0.2: -5.2,-3.25 -5.2,5.85 28.1,5.85 28.1,-3.25 -5.2,-3.25
  text ".Designator" at 6.45,0.475 h1
3D body "IDC Socket Male 20pin 2.54mm.step": height 8.93, standoff -3.47, extent -5.07,-3.155 27.93,5.695